# Altium footprint library AD_Lib.PcbLib: 508 footprints (part 24 of 32)
Each footprint in its own frame and in the unit in brackets; x right, y up, seen from the top. Pads: shape width x height; smd on the part's side, far side on the other; paste and mask are expansions set on the pad; w line width, h text height; cw(c..) or ccw(c..) is an arc to the next point about the centre after c.
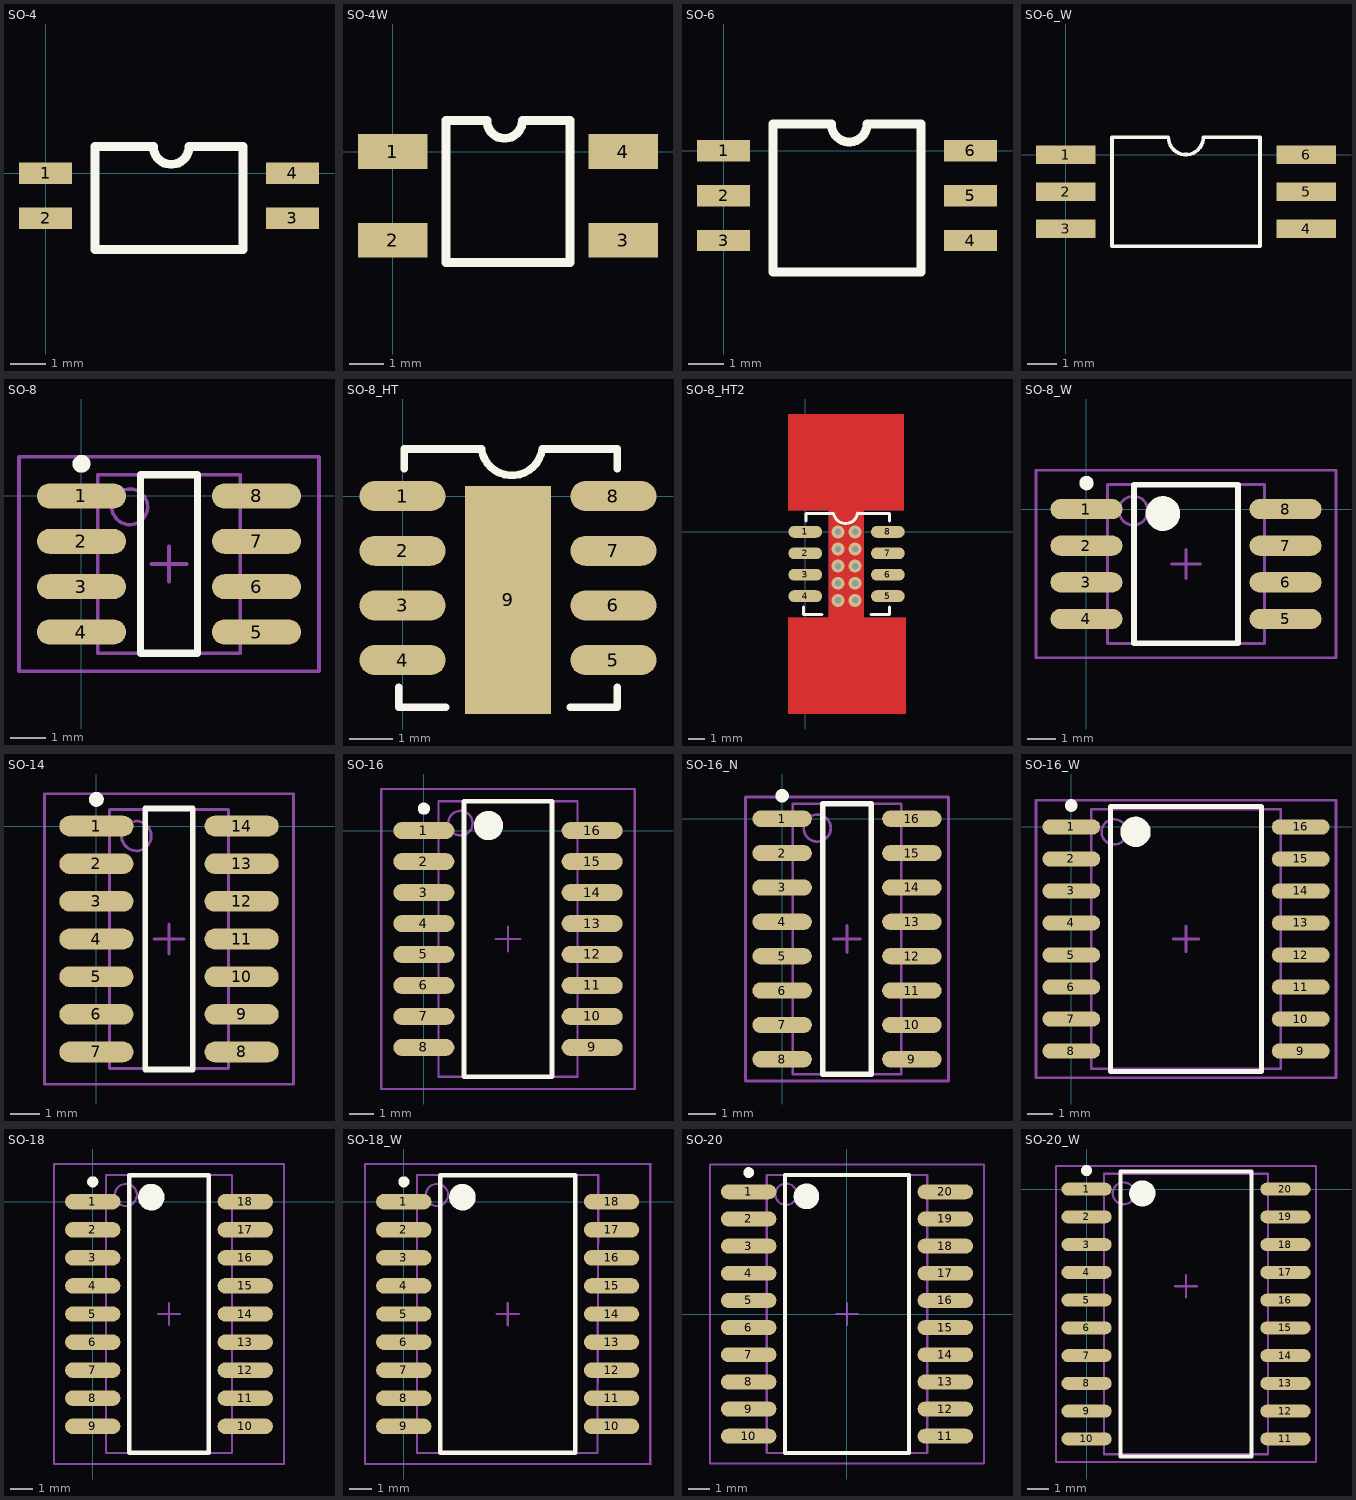
[diagram p23: the footprints below, top view; thin cyan lines are the x and y axes]

## SO-4 [mm] "SSOP-4，Pitch=50mil。如PS2801-1"
height 2.3
pads (4):
  rect 1.5x0.6 smd: 1(0,0) 2(0,-1.27) 3(6.985,-1.27) 4(6.985,0)
Top Overlay:
  lines w0.254: 2.97,0.762 1.397,0.762 1.397,-2.159 5.588,-2.159 5.588,0.762 4.07,0.762 ; 3.048,0.762 ccw(c3.556,0.762) 4.064,0.762

## SO-4W [mm] "Pitch=100mil，如HCPL-181"
height 2.2
pads (4):
  rect 2x1 smd: 1(0,0) 2(0,-2.54) 3(6.604,-2.54) 4(6.604,0)
Top Overlay:
  lines w0.254: 1.524,-3.175 5.08,-3.175 5.08,0.889 3.712,0.889 cw(c3.204,0.889) 2.696,0.889 1.524,0.889 1.524,-3.175

## SO-6 [mm] "SO-6，Pitch=50mil。如ACPL-M46T"
height 2.3
pads (6):
  rect 1.5x0.6 smd: 1(0,0) 2(0,-1.27) 3(0,-2.54) 4(6.985,-2.54) 5(6.985,-1.27) 6(6.985,0)
Top Overlay:
  lines w0.254: 2.97,0.762 1.397,0.762 1.397,-3.429 5.588,-3.429 5.588,0.762 4.07,0.762 ; 3.048,0.762 ccw(c3.556,0.762) 4.064,0.762

## SO-6_W [mil] "AVAGO系列光耦，ACPL-M60L"
height 57.09
pads (6):
  rect 80x25 smd: 1(0,0) 2(0,-50) 3(0,-100) 4(325,-100) 5(325,-50) 6(325,0)
Top Overlay:
  lines w5: 62.5,-123.62 262.5,-123.62 262.5,23.62 185.95,23.62 cw(c162.32,23.62) 138.7,23.62 62.5,23.62 62.5,-123.62

## SO-8 [mm] "SOIC, 8-Leads, Body 4.9x3.9mm, Pitch 1.27mm, IPC Low Density"
height 1.75
pads (8):
  oval 2.5x0.7 smd: 1(0,0) 2(0,-1.27) 3(0,-2.54) 4(0,-3.81) 5(4.9,-3.81) 6(4.9,-2.54) 7(4.9,-1.27) 8(4.9,0)
Top Overlay:
  circle w0.25: c0,0.9 r0.125
  lines w0.2: 1.65,-4.405 1.65,0.595 3.25,0.595 3.25,-4.405 1.65,-4.405
Mechanical 13:
  circle w0.1: c1.35,-0.305 r0.5
  lines w0.1: 0.45,-4.405 0.45,0.595 4.45,0.595 4.45,-4.405 0.45,-4.405
Mechanical 15:
  lines w0.1: 1.95,-1.905 2.95,-1.905 ; 2.45,-2.405 2.45,-1.405 ; -1.75,-4.905 -1.75,1.095 6.65,1.095 6.65,-4.905 -1.75,-4.905
3D body: height 1.75, standoff 0, extent 0.45,-4.405 4.45,0.595

## SO-8_HT [mm] "SOIC, 8-Leads, Body 4.9x3.9mm, Pitch 1.27mm, IPC Low Density"
height 1.75
pads (9):
  oval 2x0.7 smd: 1(0,0) 2(0,-1.27) 3(0,-2.54) 4(0,-3.81) 5(4.9,-3.81) 6(4.9,-2.54) 7(4.9,-1.27) 8(4.9,0)
  rect 2x5.3 smd: 9(2.45,-2.413)
Top Overlay:
  lines w0.178: -0.09,-4.445 -0.09,-4.905 1,-4.905 ; 0.037,0.635 0.037,1.095 1.834,1.095 ; 1.834,1.086 ccw(c2.54,1.196) 3.247,1.095 4.99,1.095 4.99,0.635 ; 3.9,-4.905 4.99,-4.905 4.99,-4.445

## SO-8_HT2 [mm] "SOIC, 8-Leads, Body 4.9x3.9mm, Pitch 1.27mm, IPC Low Density"
height 1.75
pads (8):
  oval 2x0.7 smd: 1(0,0) 2(0,-1.27) 3(0,-2.54) 4(0,-3.81) 5(4.9,-3.81) 6(4.9,-2.54) 7(4.9,-1.27) 8(4.9,0)
via 2.958,-4.064 diameter 0.762 hole 0.381
via 1.942,-4.064 diameter 0.762 hole 0.381
via 2.958,-3.048 diameter 0.762 hole 0.381
via 1.942,-3.048 diameter 0.762 hole 0.381
via 2.958,-2.032 diameter 0.762 hole 0.381
via 1.942,-2.032 diameter 0.762 hole 0.381
via 1.942,-1.016 diameter 0.762 hole 0.381
via 2.958,-1.016 diameter 0.762 hole 0.381
via 2.958,0 diameter 0.762 hole 0.381
via 1.942,0 diameter 0.762 hole 0.381
Top Layer:
  region: -1.016,6.985 5.842,6.985 5.842,1.27 3.466,1.27 3.466,-5.08 5.969,-5.08 5.969,-10.795 -1.016,-10.795 -1.016,-5.08 1.397,-5.08 1.397,1.27 -1.016,1.27
Bottom Layer:
  region: -1.016,6.985 5.842,6.985 5.842,1.27 3.466,1.27 3.466,-5.08 5.969,-5.08 5.969,-10.795 -1.016,-10.795 -1.016,-5.08 1.397,-5.08 1.397,1.27 -1.016,1.27
Top Overlay:
  lines w0.178: -0.09,-4.445 -0.09,-4.905 1,-4.905 ; 0.037,0.635 0.037,1.095 1.688,1.095 ccw(c2.394,1.205) 3.1,1.104 ; 3.1,1.095 4.99,1.095 4.99,0.635 ; 3.9,-4.905 4.99,-4.905 4.99,-4.445
Top Solder:
  rectangle: 1.397,-5.08 3.466,1.27

## SO-8_W [mm] "8-Pin Small Outline Package 1.27 mm Pitch, IPC Low Density"
height 2.03
pads (8):
  oval 2.5x0.7 smd: 1(0,0) 2(0,-1.27) 3(0,-2.54) 4(0,-3.81) 5(6.9,-3.81) 6(6.9,-2.54) 7(6.9,-1.27) 8(6.9,0)
Top Overlay:
  circle w0.6: c2.65,-0.155 r0.3
  circle w0.25: c0,0.9 r0.125
  lines w0.2: 1.65,-4.655 5.25,-4.655 5.25,0.845 1.65,0.845 1.65,-4.655
Mechanical 13:
  circle w0.1: c1.625,-0.055 r0.5
  lines w0.1: 0.725,-4.655 6.175,-4.655 6.175,0.845 0.725,0.845 0.725,-4.655
Mechanical 15:
  lines w0.1: 2.95,-1.905 3.95,-1.905 ; 3.45,-2.405 3.45,-1.405 ; -1.75,-5.155 8.65,-5.155 8.65,1.345 -1.75,1.345 -1.75,-5.155
3D body: height 2.03, standoff 0, extent 0.725,-4.655 6.175,0.845

## SO-14 [mm] "SOIC, 14-Leads, Body 8.7x3.9mm, Pitch 1.27mm, IPC Low Density"
height 1.75
pads (14):
  oval 2.5x0.7 smd: 1(0,0) 2(0,-1.27) 3(0,-2.54) 4(0,-3.81) 5(0,-5.08) 6(0,-6.35) 7(0,-7.62) 8(4.9,-7.62) 9(4.9,-6.35) 10(4.9,-5.08) 11(4.9,-3.81) 12(4.9,-2.54) 13(4.9,-1.27) 14(4.9,0)
Top Overlay:
  circle w0.25: c0,0.9 r0.125
  lines w0.2: 1.65,-8.21 3.25,-8.21 3.25,0.59 1.65,0.59 1.65,-8.21
Mechanical 13:
  circle w0.1: c1.35,-0.335 r0.5
  lines w0.1: 0.45,-8.185 4.45,-8.185 4.45,0.565 0.45,0.565 0.45,-8.185
Mechanical 15:
  lines w0.1: 1.95,-3.81 2.95,-3.81 ; 2.45,-4.31 2.45,-3.31 ; -1.75,-8.71 6.65,-8.71 6.65,1.09 -1.75,1.09 -1.75,-8.71
3D body: height 1.75, standoff 0, extent 0.45,-8.185 4.45,0.565

## SO-16 [mm] "16-Pin Small Outline Package 1.27 mm Pitch, IPC Low Density"
height 2.2
pads (16):
  oval 2.5x0.7 smd: 1(0,0) 2(0,-1.27) 3(0,-2.54) 4(0,-3.81) 5(0,-5.08) 6(0,-6.35) 7(0,-7.62) 8(0,-8.89) 9(6.9,-8.89) 10(6.9,-7.62) 11(6.9,-6.35) 12(6.9,-5.08) 13(6.9,-3.81) 14(6.9,-2.54) 15(6.9,-1.27) 16(6.9,0)
Top Overlay:
  circle w0.25: c0,0.9 r0.125
  circle w0.6: c2.65,0.205 r0.3
  lines w0.2: 1.65,-10.095 1.65,1.205 5.25,1.205 5.25,-10.095 1.65,-10.095
Mechanical 13:
  circle w0.1: c1.5,0.305 r0.5
  lines w0.1: 0.6,-10.095 0.6,1.205 6.3,1.205 6.3,-10.095 0.6,-10.095
Mechanical 15:
  lines w0.1: 2.95,-4.445 3.95,-4.445 ; 3.45,-4.945 3.45,-3.945 ; -1.75,-10.595 -1.75,1.705 8.65,1.705 8.65,-10.595 -1.75,-10.595
3D body: height 2.2, standoff 0, extent 0.6,-10.095 6.3,1.205

## SO-16_N [mm] "SOIC, 16-Leads, Body 9.9x3.9mm, Pitch 1.27mm, IPC Medium Density"
height 1.75
pads (16):
  oval 2.2x0.6 smd: 1(0,0) 2(0,-1.27) 3(0,-2.54) 4(0,-3.81) 5(0,-5.08) 6(0,-6.35) 7(0,-7.62) 8(0,-8.89) 9(4.8,-8.89) 10(4.8,-7.62) 11(4.8,-6.35) 12(4.8,-5.08) 13(4.8,-3.81) 14(4.8,-2.54) 15(4.8,-1.27) 16(4.8,0)
Top Overlay:
  circle w0.25: c0,0.85 r0.125
  lines w0.2: 1.5,-9.445 1.5,0.555 3.3,0.555 3.3,-9.445 1.5,-9.445
Mechanical 13:
  circle w0.1: c1.3,-0.345 r0.5
  lines w0.1: 0.4,-9.445 0.4,0.555 4.4,0.555 4.4,-9.445 0.4,-9.445
Mechanical 15:
  lines w0.1: 1.9,-4.445 2.9,-4.445 ; 2.4,-4.945 2.4,-3.945 ; -1.35,-9.695 -1.35,0.805 6.15,0.805 6.15,-9.695 -1.35,-9.695
3D body: height 1.75, standoff 0, extent 0.4,-9.445 4.4,0.555

## SO-16_W [mm] "宽体SO-16，如ADuM1410BRWZ"
height 2.65
pads (16):
  oval 2.3x0.6 smd: 1(0,0) 2(0,-1.27) 3(0,-2.54) 4(0,-3.81) 5(0,-5.08) 6(0,-6.35) 7(0,-7.62) 8(0,-8.89) 9(9.1,-8.89) 10(9.1,-7.62) 11(9.1,-6.35) 12(9.1,-5.08) 13(9.1,-3.81) 14(9.1,-2.54) 15(9.1,-1.27) 16(9.1,0)
Top Overlay:
  circle w0.25: c0,0.85 r0.125
  circle w0.6: c2.55,-0.195 r0.3
  lines w0.2: 1.55,-9.695 1.55,0.805 7.55,0.805 7.55,-9.695 1.55,-9.695
Mechanical 13:
  circle w0.1: c1.7,-0.195 r0.5
  lines w0.1: 0.8,-9.595 0.8,0.705 8.3,0.705 8.3,-9.595 0.8,-9.595
Mechanical 15:
  lines w0.1: 4.05,-4.445 5.05,-4.445 ; 4.55,-4.945 4.55,-3.945 ; -1.4,-9.945 -1.4,1.055 10.5,1.055 10.5,-9.945 -1.4,-9.945
3D body: height 2.65, standoff 0, extent 0.8,-9.595 8.3,0.705

## SO-18 [mm] "18-Pin Small Outline Package 1.27 mm Pitch, IPC Low Density"
height 2.2
pads (18):
  oval 2.5x0.7 smd: 1(0,0) 2(0,-1.27) 3(0,-2.54) 4(0,-3.81) 5(0,-5.08) 6(0,-6.35) 7(0,-7.62) 8(0,-8.89) 9(0,-10.16) 10(6.9,-10.16) 11(6.9,-8.89) 12(6.9,-7.62) 13(6.9,-6.35) 14(6.9,-5.08) 15(6.9,-3.81) 16(6.9,-2.54) 17(6.9,-1.27) 18(6.9,0)
Top Overlay:
  circle w0.25: c0,0.9 r0.125
  circle w0.6: c2.65,0.205 r0.3
  lines w0.2: 1.65,-11.365 1.65,1.205 5.25,1.205 5.25,-11.365 1.65,-11.365
Mechanical 13:
  circle w0.1: c1.5,0.305 r0.5
  lines w0.1: 0.6,-11.365 0.6,1.205 6.3,1.205 6.3,-11.365 0.6,-11.365
Mechanical 15:
  lines w0.1: 2.95,-5.08 3.95,-5.08 ; 3.45,-5.58 3.45,-4.58 ; -1.75,-11.865 -1.75,1.705 8.65,1.705 8.65,-11.865 -1.75,-11.865
3D body: height 2.2, standoff 0, extent 0.6,-11.365 6.3,1.205

## SO-18_W [mm] "SO-18宽体，ULN2803ADW"
height 2.65
pads (18):
  oval 2.5x0.7 smd: 1(0,0) 2(0,-1.27) 3(0,-2.54) 4(0,-3.81) 5(0,-5.08) 6(0,-6.35) 7(0,-7.62) 8(0,-8.89) 9(0,-10.16) 10(9.4,-10.16) 11(9.4,-8.89) 12(9.4,-7.62) 13(9.4,-6.35) 14(9.4,-5.08) 15(9.4,-3.81) 16(9.4,-2.54) 17(9.4,-1.27) 18(9.4,0)
Top Overlay:
  circle w0.6: c2.65,0.205 r0.3
  circle w0.25: c0,0.9 r0.125
  lines w0.2: 7.747,1.205 1.65,1.205 1.65,-11.365 7.747,-11.365 7.75,1.205
Mechanical 13:
  circle w0.1: c1.5,0.305 r0.5
  lines w0.1: 8.763,1.205 0.6,1.205 0.6,-11.365 8.763,-11.365 8.8,1.205
Mechanical 15:
  lines w0.1: 4.208,-5.08 5.208,-5.08 ; 4.7,-5.588 4.7,-4.588 ; 11.15,-11.865 11.15,1.705 ; 11.176,-11.865 -1.75,-11.865 -1.75,1.705 11.176,1.705
3D body: height 2.2, standoff 0, extent 0.75,-11.365 8.8,1.205

## SO-20 [mm] "SOIC, 20-Leads, Body 12.8x7.5mm, Pitch 1.27mm, IPC Low Density"
height 2.65
pads (20):
  oval 2.6x0.7 smd: 1(-4.6,5.715) 2(-4.6,4.445) 3(-4.6,3.175) 4(-4.6,1.905) 5(-4.6,0.635) 6(-4.6,-0.635) 7(-4.6,-1.905) 8(-4.6,-3.175) 9(-4.6,-4.445) 10(-4.6,-5.715) 11(4.6,-5.715) 12(4.6,-4.445) 13(4.6,-3.175) 14(4.6,-1.905) 15(4.6,-0.635) 16(4.6,0.635) 17(4.6,1.905) 18(4.6,3.175) 19(4.6,4.445) 20(4.6,5.715)
Top Overlay:
  circle w0.6: c-1.9,5.5 r0.3
  circle w0.25: c-4.6,6.615 r0.125
  lines w0.2: -2.9,-6.5 2.9,-6.5 2.9,6.5 -2.9,6.5 -2.9,-6.5
Mechanical 13:
  circle w0.1: c-2.85,5.6 r0.5
  lines w0.1: -3.75,-6.5 3.75,-6.5 3.75,6.5 -3.75,6.5 -3.75,-6.5
Mechanical 15:
  lines w0.1: -0.5,0 0.5,0 ; 0,-0.5 0,0.5 ; -6.4,-7 6.4,-7 6.4,7 -6.4,7 -6.4,-7
3D body: height 2.65, standoff 0, extent -3.75,-6.5 3.75,6.5

## SO-20_W [mm] "宽体SO-20，如ADM2587"
height 2.65
pads (20):
  oval 2.3x0.6 smd: 1(0,0) 2(0,-1.27) 3(0,-2.54) 4(0,-3.81) 5(0,-5.08) 6(0,-6.35) 7(0,-7.62) 8(0,-8.89) 9(0,-10.16) 10(0,-11.43) 11(9.1,-11.43) 12(9.1,-10.16) 13(9.1,-8.89) 14(9.1,-7.62) 15(9.1,-6.35) 16(9.1,-5.08) 17(9.1,-3.81) 18(9.1,-2.54) 19(9.1,-1.27) 20(9.1,0)
Top Overlay:
  circle w0.6: c2.55,-0.195 r0.3
  circle w0.25: c0,0.85 r0.125
  lines w0.2: 1.55,-12.235 1.55,0.805 7.55,0.805 7.55,-12.235 1.55,-12.235
Mechanical 13:
  circle w0.1: c1.7,-0.195 r0.5
  lines w0.1: 0.8,-12.135 0.8,0.705 8.3,0.705 8.3,-12.135 0.8,-12.135
Mechanical 15:
  lines w0.1: 4.05,-4.445 5.05,-4.445 ; 4.55,-4.945 4.55,-3.945 ; -1.4,-12.485 -1.4,1.055 10.5,1.055 10.5,-12.485 -1.4,-12.485
3D body: height 2.65, standoff 0, extent 0.8,-12.135 8.3,0.705